# Altium footprint library xialeste-20221201.PcbLib: 195 footprints (part 8 of 13)
Each footprint in its own frame and in the unit in brackets; x right, y up, seen from the top. Pads: shape width x height; smd on the part's side, far side on the other; paste and mask are expansions set on the pad; w line width, h text height; cw(c..) or ccw(c..) is an arc to the next point about the centre after c.
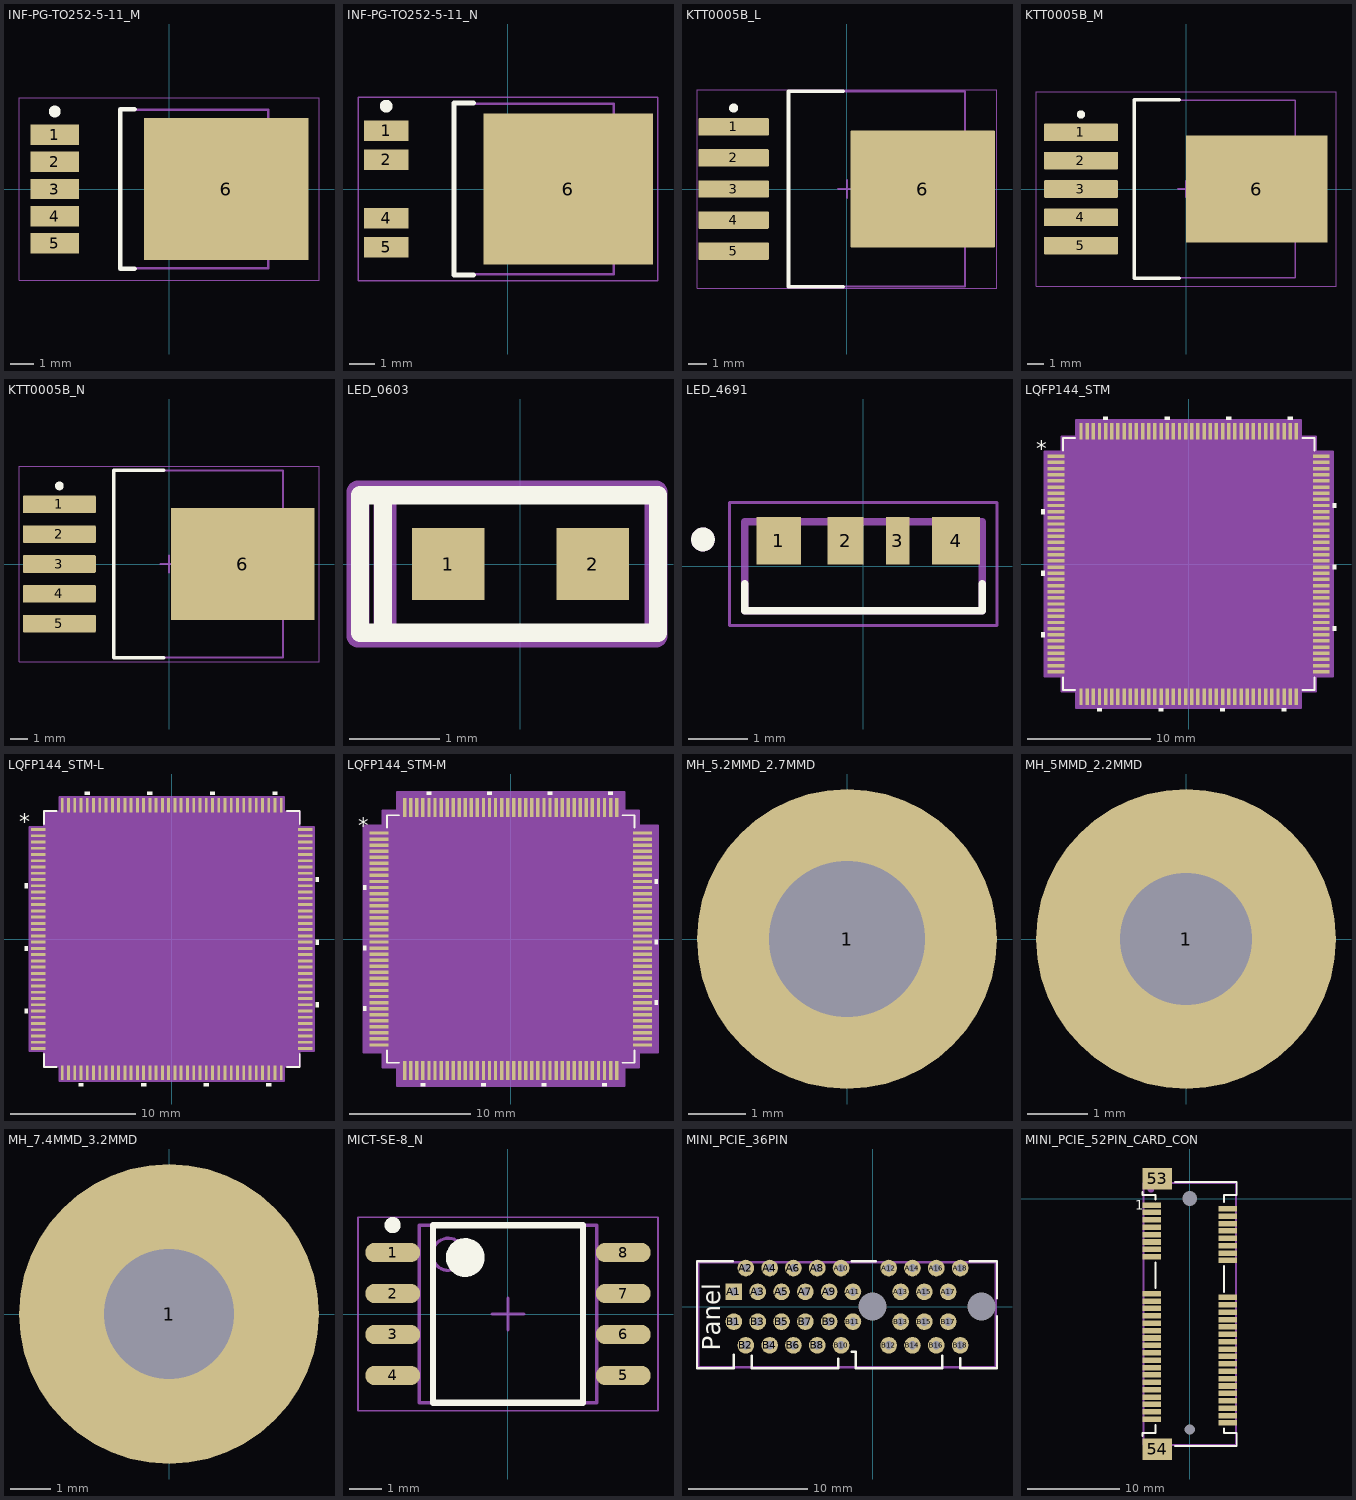
[diagram p7: the footprints below, top view; thin cyan lines are the x and y axes]

## INF-PG-TO252-5-11_M [mm] "DPAK, 5-Leads, Body 6.5x6.12mm, Pitch 1.14mm, IPC Low Density"
height 2.35
pads (6):
  rect 2.05x0.85 smd: 1(-4.8,2.28) 2(-4.8,1.14) 3(-4.8,0) 4(-4.8,-1.14) 5(-4.8,-2.28)
  rect 6.9x5.95 smd: 6(2.4,0)
Top Overlay:
  circle w0.25: c-4.8,3.255 r0.125
  lines w0.2: -1.45,-3.35 -2.05,-3.35 -2.05,3.35 -1.45,3.35
Mechanical 13:
  lines w0.1: -2.05,-3.325 4.17,-3.325 4.17,3.325 -2.05,3.325 -2.05,-3.325
Mechanical 15:
  lines w0.05: -6.3,-3.825 6.3,-3.825 6.3,3.825 -6.3,3.825 -6.3,-3.825
  lines w0.1: -0.5,0 0.5,0 ; 0,-0.5 0,0.5
3D body "to252-4_p1-27_l6-8_w5-8.stp": height 2.4, standoff -0.01, extent -5.316,-3.435 4.884,3.365

## INF-PG-TO252-5-11_N [mm] "DPAK, 5-Leads, Body 6.5x6.12mm, Pitch 1.14mm, IPC Medium Density"
height 2.35
pads (5):
  rect 1.75x0.8 smd: 1(-4.75,2.28) 2(-4.75,1.14) 4(-4.75,-1.14) 5(-4.75,-2.28)
  rect 6.6x5.9 smd: 6(2.35,0)
Top Overlay:
  circle w0.25: c-4.75,3.23 r0.125
  lines w0.2: -1.35,-3.35 -2.1,-3.35 -2.1,3.35 -1.35,3.35
Mechanical 13:
  lines w0.1: -2.1,-3.325 4.12,-3.325 4.12,3.325 -2.1,3.325 -2.1,-3.325
Mechanical 15:
  lines w0.05: -5.85,-3.575 5.85,-3.575 5.85,3.575 -5.85,3.575 -5.85,-3.575
  lines w0.1: -0.5,0 0.5,0 ; 0,-0.5 0,0.5
3D body: height 2.35, standoff 0, extent -2.1,-3.325 4.12,3.325

## KTT0005B_L [mm] "DPAK, 5-Leads, Body 10.65x9.65mm, Pitch 1.7mm, IPC High Density"
height 4.83
pads (6):
  rrect11% 3.85x0.95 smd: 1(-6.2,3.4) 2(-6.2,1.7) 3(-6.2,0) 4(-6.2,-1.7) 5(-6.2,-3.4)
  rrect2% 7.9x6.4 smd: 6(4.15,0)
Top Overlay:
  circle w0.25: c-6.2,4.425 r0.125
  lines w0.2: -0.2,-5.35 -3.2,-5.35 -3.2,5.35 -0.2,5.35
Mechanical 1:
  text ".Designator" at -1.905,-0.508 h1.3
Mechanical 13:
  lines w0.1: -3.2,-5.325 -3.2,5.325 6.45,5.325 6.45,-5.325 -3.2,-5.325
Mechanical 15:
  lines w0.05: -8.2,-5.425 -8.2,5.425 8.2,5.425 8.2,-5.425 -8.2,-5.425
  lines w0.1: -0.5,0 0.5,0 ; 0,-0.5 0,0.5
3D body: height 4.83, standoff 0, extent -3.2,-5.325 6.45,5.325

## KTT0005B_M [mm] "DPAK, 5-Leads, Body 10.65x9.65mm, Pitch 1.7mm, IPC Low Density"
height 4.83
pads (6):
  rrect10% 4.45x1.05 smd: 1(-6.3,3.4) 2(-6.3,1.7) 3(-6.3,0) 4(-6.3,-1.7) 5(-6.3,-3.4)
  rrect2% 8.5x6.45 smd: 6(4.25,0)
Top Overlay:
  circle w0.25: c-6.3,4.475 r0.125
  lines w0.2: -0.4,-5.35 -3.1,-5.35 -3.1,5.35 -0.4,5.35
Mechanical 1:
  text ".Designator" at -2.225,-0.779 h1.3
Mechanical 13:
  lines w0.1: -3.1,-5.325 -3.1,5.325 6.55,5.325 6.55,-5.325 -3.1,-5.325
Mechanical 15:
  lines w0.05: -9,-5.825 -9,5.825 9,5.825 9,-5.825 -9,-5.825
  lines w0.1: -0.5,0 0.5,0 ; 0,-0.5 0,0.5
3D body "TO-263BA.stp": height 4.8, standoff 0, extent -7.825,-5.293 8.025,5.35

## KTT0005B_N [mm] "DPAK, 5-Leads, Body 10.65x9.65mm, Pitch 1.7mm, IPC Medium Density"
height 4.83
pads (6):
  rrect10% 4.15x1 smd: 1(-6.25,3.4) 2(-6.25,1.7) 3(-6.25,0) 4(-6.25,-1.7) 5(-6.25,-3.4)
  rrect2% 8.2x6.4 smd: 6(4.2,0)
Top Overlay:
  circle w0.25: c-6.25,4.45 r0.125
  lines w0.2: -0.3,-5.35 -3.15,-5.35 -3.15,5.35 -0.3,5.35
Mechanical 1:
  text ".Designator" at -1.905,-0.508 h1.3
Mechanical 13:
  lines w0.1: -3.15,-5.325 -3.15,5.325 6.5,5.325 6.5,-5.325 -3.15,-5.325
Mechanical 15:
  lines w0.05: -8.55,-5.575 -8.55,5.575 8.55,5.575 8.55,-5.575 -8.55,-5.575
  lines w0.1: -0.5,0 0.5,0 ; 0,-0.5 0,0.5
3D body "TO-263BA.stp": height 4.8, standoff 0, extent -7.99,-5.324 7.86,5.319

## LED_0603 [mm]
pads (2):
  rect 0.8x0.8 smd: 1(-0.8,0) 2(0.8,0)
Top Overlay:
  lines w0.2: -1.524,-0.762 -1.524,0.762 ; -1.778,-0.762 1.524,-0.762 1.524,0.762 -1.778,0.762 -1.778,-0.762
Mechanical 29:
  lines w0.254: -1.5,-0.8 -1.5,0.8 ; -1.8,-0.8 -1.8,0.8 1.5,0.8 1.5,-0.8 -1.8,-0.8
  text ".Designator" at 0.5,0.3 h0.6
3D body "LED SMD 0603.step": height 0.65, standoff 0, extent -0.85,-0.4 0.85,0.4
3D body: height 0.66, standoff 0.5, extent -0.2,-0.2 0.2,0.2

## LED_4691 [mm]
height 2.05
pads (4):
  rect 0.75x0.8 smd: 1(-1.425,0.425)
  rect 0.6x0.8 smd: 2(-0.3,0.425)
  rect 0.4x0.8 smd: 3(0.58,0.425)
  rect 0.8x0.8 smd: 4(1.56,0.425)
Top Overlay:
  circle w0.2: c-2.7,0.45 r0.1
  lines w0.127: -2,-0.295 -2,-0.75 2,-0.75 2,-0.295
Mechanical 13:
  circle w0.2: c-2.7,0.45 r0.1
  lines w0.127: -2,-0.75 2,-0.75 2,0.75 -2,0.75 -2,-0.75
Mechanical 15:
  lines w0.05: -2.25,-1 2.25,-1 2.25,1.075 -2.25,1.075 -2.25,-1

## LQFP144_STM [mil]
pads (144):
  rect 53.5x11 smd paste+0 mask+0: 1(-424.25,344.49) 2(-424.25,324.8) 3(-424.25,305.12) 4(-424.25,285.43) 5(-424.25,265.75) 6(-424.25,246.06) 7(-424.25,226.38) 8(-424.25,206.69) 9(-424.25,187.01) 10(-424.25,167.32) 11(-424.25,147.64) 12(-424.25,127.95) 13(-424.25,108.27) 14(-424.25,88.58) 15(-424.25,68.9) 16(-424.25,49.21) 17(-424.25,29.53) 18(-424.25,9.84) 19(-424.25,-9.84) 20(-424.25,-29.53) 21(-424.25,-49.21) 22(-424.25,-68.9) 23(-424.25,-88.58) 24(-424.25,-108.27) 25(-424.25,-127.95) 26(-424.25,-147.64) 27(-424.25,-167.32) 28(-424.25,-187.01) 29(-424.25,-206.69) 30(-424.25,-226.38) 31(-424.25,-246.06) 32(-424.25,-265.75) 33(-424.25,-285.43) 34(-424.25,-305.12) 35(-424.25,-324.8) 36(-424.25,-344.49) 73(424.25,-344.49) 74(424.25,-324.8) 75(424.25,-305.12) 76(424.25,-285.43) 77(424.25,-265.75) 78(424.25,-246.06) 79(424.25,-226.38) 80(424.25,-206.69) 81(424.25,-187.01) 82(424.25,-167.32) 83(424.25,-147.64) 84(424.25,-127.95) 85(424.25,-108.27) 86(424.25,-88.58) 87(424.25,-68.9) 88(424.25,-49.21) 89(424.25,-29.53) 90(424.25,-9.84) 91(424.25,9.84) 92(424.25,29.53) 93(424.25,49.21) 94(424.25,68.9) 95(424.25,88.58) 96(424.25,108.27) 97(424.25,127.95) 98(424.25,147.64) 99(424.25,167.32) 100(424.25,187.01) 101(424.25,206.69) 102(424.25,226.38) 103(424.25,246.06) 104(424.25,265.75) 105(424.25,285.43) 106(424.25,305.12) 107(424.25,324.8) 108(424.25,344.49)
  rect 11x53.5 smd paste+0 mask+0: 37(-344.49,-424.25) 38(-324.8,-424.25) 39(-305.12,-424.25) 40(-285.43,-424.25) 41(-265.75,-424.25) 42(-246.06,-424.25) 43(-226.38,-424.25) 44(-206.69,-424.25) 45(-187.01,-424.25) 46(-167.32,-424.25) 47(-147.64,-424.25) 48(-127.95,-424.25) 49(-108.27,-424.25) 50(-88.58,-424.25) 51(-68.9,-424.25) 52(-49.21,-424.25) 53(-29.53,-424.25) 54(-9.84,-424.25) 55(9.84,-424.25) 56(29.53,-424.25) 57(49.21,-424.25) 58(68.9,-424.25) 59(88.58,-424.25) 60(108.27,-424.25) 61(127.95,-424.25) 62(147.64,-424.25) 63(167.32,-424.25) 64(187.01,-424.25) 65(206.69,-424.25) 66(226.38,-424.25) 67(246.06,-424.25) 68(265.75,-424.25) 69(285.43,-424.25) 70(305.12,-424.25) 71(324.8,-424.25) 72(344.49,-424.25) 109(344.49,424.25) 110(324.8,424.25) 111(305.12,424.25) 112(285.43,424.25) 113(265.75,424.25) 114(246.06,424.25) 115(226.38,424.25) 116(206.69,424.25) 117(187.01,424.25) 118(167.32,424.25) 119(147.64,424.25) 120(127.95,424.25) 121(108.27,424.25) 122(88.58,424.25) 123(68.9,424.25) 124(49.21,424.25) 125(29.53,424.25) 126(9.84,424.25) 127(-9.84,424.25) 128(-29.53,424.25) 129(-49.21,424.25) 130(-68.9,424.25) 131(-88.58,424.25) 132(-108.27,424.25) 133(-127.95,424.25) 134(-147.64,424.25) 135(-167.32,424.25) 136(-187.01,424.25) 137(-206.69,424.25) 138(-226.38,424.25) 139(-246.06,424.25) 140(-265.75,424.25) 141(-285.43,424.25) 142(-305.12,424.25) 143(-324.8,424.25) 144(-344.49,424.25)
Top Overlay:
  region: -461,174.82 -471,174.82 -471,159.82 -461,159.82
  region: -461,-22.03 -471,-22.03 -471,-37.03 -461,-37.03
  region: -461,-218.88 -471,-218.88 -471,-233.88 -461,-233.88
  region: -277.93,-461 -292.93,-461 -292.93,-471 -277.93,-471
  region: -81.08,-461 -96.08,-461 -96.08,-471 -81.08,-471
  region: 115.77,-461 100.77,-461 100.77,-471 115.77,-471
  region: 312.62,-461 297.62,-461 297.62,-471 312.62,-471
  region: 461,-199.19 471,-199.19 471,-214.19 461,-214.19
  region: 461,-2.34 471,-2.34 471,-17.34 461,-17.34
  region: 461,194.51 471,194.51 471,179.51 461,179.51
  region: 332.3,461 317.3,461 317.3,471 332.3,471
  region: 135.45,461 120.45,461 120.45,471 135.45,471
  region: -61.4,461 -76.4,461 -76.4,471 -61.4,471
  region: -258.25,461 -273.25,461 -273.25,471 -258.25,471
  lines w6: -402.5,-363.09 -402.5,-402.5 -363.09,-402.5 ; -402.5,363.09 -402.5,402.5 -363.09,402.5 ; 363.09,-402.5 402.5,-402.5 402.5,-363.09 ; 363.09,402.5 402.5,402.5 402.5,363.09
  text "*" at -488.5,344.33 h50
Mechanical 13:
  drawing of 581 lines, arcs and shapes, not listed
  text "*" at -395,329.33 h50
Mechanical 15:
  region: -359.99,-407.5 -407.5,-407.5 -407.5,-359.99 -461,-359.99 -461,359.99 -407.5,359.99 -407.5,407.5 -359.99,407.5 -359.99,461 359.99,461 359.99,407.5 407.5,407.5 407.5,359.99 461,359.99 461,-359.99 407.5,-359.99 407.5,-407.5 359.99,-407.5 359.99,-461 -359.99,-461
  lines w6: -461,-359.99 -407.5,-359.99 -407.5,-407.5 -359.99,-407.5 -359.99,-461 359.99,-461 359.99,-407.5 407.5,-407.5 407.5,-359.99 461,-359.99 461,359.99 407.5,359.99 407.5,407.5 359.99,407.5 359.99,461 -359.99,461 -359.99,407.5 -407.5,407.5 -407.5,359.99 -461,359.99 -461,-359.99
3D body "LQFP144_STM.step": height 63.11, standoff 0, extent -437.01,-437.01 437.01,437.01

## LQFP144_STM-L [mil]
pads (144):
  rect 45.5x9 smd paste+0 mask+0: 1(-420.25,344.49) 2(-420.25,324.8) 3(-420.25,305.12) 4(-420.25,285.43) 5(-420.25,265.75) 6(-420.25,246.06) 7(-420.25,226.38) 8(-420.25,206.69) 9(-420.25,187.01) 10(-420.25,167.32) 11(-420.25,147.64) 12(-420.25,127.95) 13(-420.25,108.27) 14(-420.25,88.58) 15(-420.25,68.9) 16(-420.25,49.21) 17(-420.25,29.53) 18(-420.25,9.84) 19(-420.25,-9.84) 20(-420.25,-29.53) 21(-420.25,-49.21) 22(-420.25,-68.9) 23(-420.25,-88.58) 24(-420.25,-108.27) 25(-420.25,-127.95) 26(-420.25,-147.64) 27(-420.25,-167.32) 28(-420.25,-187.01) 29(-420.25,-206.69) 30(-420.25,-226.38) 31(-420.25,-246.06) 32(-420.25,-265.75) 33(-420.25,-285.43) 34(-420.25,-305.12) 35(-420.25,-324.8) 36(-420.25,-344.49) 73(420.25,-344.49) 74(420.25,-324.8) 75(420.25,-305.12) 76(420.25,-285.43) 77(420.25,-265.75) 78(420.25,-246.06) 79(420.25,-226.38) 80(420.25,-206.69) 81(420.25,-187.01) 82(420.25,-167.32) 83(420.25,-147.64) 84(420.25,-127.95) 85(420.25,-108.27) 86(420.25,-88.58) 87(420.25,-68.9) 88(420.25,-49.21) 89(420.25,-29.53) 90(420.25,-9.84) 91(420.25,9.84) 92(420.25,29.53) 93(420.25,49.21) 94(420.25,68.9) 95(420.25,88.58) 96(420.25,108.27) 97(420.25,127.95) 98(420.25,147.64) 99(420.25,167.32) 100(420.25,187.01) 101(420.25,206.69) 102(420.25,226.38) 103(420.25,246.06) 104(420.25,265.75) 105(420.25,285.43) 106(420.25,305.12) 107(420.25,324.8) 108(420.25,344.49)
  rect 9x45.5 smd paste+0 mask+0: 37(-344.49,-420.25) 38(-324.8,-420.25) 39(-305.12,-420.25) 40(-285.43,-420.25) 41(-265.75,-420.25) 42(-246.06,-420.25) 43(-226.38,-420.25) 44(-206.69,-420.25) 45(-187.01,-420.25) 46(-167.32,-420.25) 47(-147.64,-420.25) 48(-127.95,-420.25) 49(-108.27,-420.25) 50(-88.58,-420.25) 51(-68.9,-420.25) 52(-49.21,-420.25) 53(-29.53,-420.25) 54(-9.84,-420.25) 55(9.84,-420.25) 56(29.53,-420.25) 57(49.21,-420.25) 58(68.9,-420.25) 59(88.58,-420.25) 60(108.27,-420.25) 61(127.95,-420.25) 62(147.64,-420.25) 63(167.32,-420.25) 64(187.01,-420.25) 65(206.69,-420.25) 66(226.38,-420.25) 67(246.06,-420.25) 68(265.75,-420.25) 69(285.43,-420.25) 70(305.12,-420.25) 71(324.8,-420.25) 72(344.49,-420.25) 109(344.49,420.25) 110(324.8,420.25) 111(305.12,420.25) 112(285.43,420.25) 113(265.75,420.25) 114(246.06,420.25) 115(226.38,420.25) 116(206.69,420.25) 117(187.01,420.25) 118(167.32,420.25) 119(147.64,420.25) 120(127.95,420.25) 121(108.27,420.25) 122(88.58,420.25) 123(68.9,420.25) 124(49.21,420.25) 125(29.53,420.25) 126(9.84,420.25) 127(-9.84,420.25) 128(-29.53,420.25) 129(-49.21,420.25) 130(-68.9,420.25) 131(-88.58,420.25) 132(-108.27,420.25) 133(-127.95,420.25) 134(-147.64,420.25) 135(-167.32,420.25) 136(-187.01,420.25) 137(-206.69,420.25) 138(-226.38,420.25) 139(-246.06,420.25) 140(-265.75,420.25) 141(-285.43,420.25) 142(-305.12,420.25) 143(-324.8,420.25) 144(-344.49,420.25)
Top Overlay:
  region: -258.25,453 -273.25,453 -273.25,463 -258.25,463
  region: -61.4,453 -76.4,453 -76.4,463 -61.4,463
  region: 135.45,453 120.45,453 120.45,463 135.45,463
  region: 332.3,453 317.3,453 317.3,463 332.3,463
  region: 453,194.51 463,194.51 463,179.51 453,179.51
  region: 453,-2.34 463,-2.34 463,-17.34 453,-17.34
  region: 453,-199.19 463,-199.19 463,-214.19 453,-214.19
  region: 312.62,-453 297.62,-453 297.62,-463 312.62,-463
  region: 115.77,-453 100.77,-453 100.77,-463 115.77,-463
  region: -81.08,-453 -96.08,-453 -96.08,-463 -81.08,-463
  region: -277.93,-453 -292.93,-453 -292.93,-463 -277.93,-463
  region: -453,-218.88 -463,-218.88 -463,-233.88 -453,-233.88
  region: -453,-22.03 -463,-22.03 -463,-37.03 -453,-37.03
  region: -453,174.82 -463,174.82 -463,159.82 -453,159.82
  lines w6: -402.5,-362.09 -402.5,-402.5 -362.09,-402.5 ; -402.5,362.09 -402.5,402.5 -362.09,402.5 ; 362.09,-402.5 402.5,-402.5 402.5,-362.09 ; 362.09,402.5 402.5,402.5 402.5,362.09
  text "*" at -480.5,344.33 h50
Mechanical 13:
  drawing of 581 lines, arcs and shapes, not listed
  text "*" at -395,329.33 h50
Mechanical 15:
  region: -352.99,-401.5 -401.5,-401.5 -401.5,-352.99 -447,-352.99 -447,352.99 -401.5,352.99 -401.5,401.5 -352.99,401.5 -352.99,447 352.99,447 352.99,401.5 401.5,401.5 401.5,352.99 447,352.99 447,-352.99 401.5,-352.99 401.5,-401.5 352.99,-401.5 352.99,-447 -352.99,-447
  lines w6: -447,-352.99 -447,352.99 -401.5,352.99 -401.5,401.5 -352.99,401.5 -352.99,447 352.99,447 352.99,401.5 401.5,401.5 401.5,352.99 447,352.99 447,-352.99 401.5,-352.99 401.5,-401.5 352.99,-401.5 352.99,-447 -352.99,-447 -352.99,-401.5 -401.5,-401.5 -401.5,-352.99 -447,-352.99
3D body "LQFP144_STM.step": height 63.11, standoff 0, extent -437.01,-437.01 437.01,437.01

## LQFP144_STM-M [mil]
pads (144):
  rect 61.5x11 smd paste+0 mask+0: 1(-428.25,344.49) 2(-428.25,324.8) 3(-428.25,305.12) 4(-428.25,285.43) 5(-428.25,265.75) 6(-428.25,246.06) 7(-428.25,226.38) 8(-428.25,206.69) 9(-428.25,187.01) 10(-428.25,167.32) 11(-428.25,147.64) 12(-428.25,127.95) 13(-428.25,108.27) 14(-428.25,88.58) 15(-428.25,68.9) 16(-428.25,49.21) 17(-428.25,29.53) 18(-428.25,9.84) 19(-428.25,-9.84) 20(-428.25,-29.53) 21(-428.25,-49.21) 22(-428.25,-68.9) 23(-428.25,-88.58) 24(-428.25,-108.27) 25(-428.25,-127.95) 26(-428.25,-147.64) 27(-428.25,-167.32) 28(-428.25,-187.01) 29(-428.25,-206.69) 30(-428.25,-226.38) 31(-428.25,-246.06) 32(-428.25,-265.75) 33(-428.25,-285.43) 34(-428.25,-305.12) 35(-428.25,-324.8) 36(-428.25,-344.49) 73(428.25,-344.49) 74(428.25,-324.8) 75(428.25,-305.12) 76(428.25,-285.43) 77(428.25,-265.75) 78(428.25,-246.06) 79(428.25,-226.38) 80(428.25,-206.69) 81(428.25,-187.01) 82(428.25,-167.32) 83(428.25,-147.64) 84(428.25,-127.95) 85(428.25,-108.27) 86(428.25,-88.58) 87(428.25,-68.9) 88(428.25,-49.21) 89(428.25,-29.53) 90(428.25,-9.84) 91(428.25,9.84) 92(428.25,29.53) 93(428.25,49.21) 94(428.25,68.9) 95(428.25,88.58) 96(428.25,108.27) 97(428.25,127.95) 98(428.25,147.64) 99(428.25,167.32) 100(428.25,187.01) 101(428.25,206.69) 102(428.25,226.38) 103(428.25,246.06) 104(428.25,265.75) 105(428.25,285.43) 106(428.25,305.12) 107(428.25,324.8) 108(428.25,344.49)
  rect 11x61.5 smd paste+0 mask+0: 37(-344.49,-428.25) 38(-324.8,-428.25) 39(-305.12,-428.25) 40(-285.43,-428.25) 41(-265.75,-428.25) 42(-246.06,-428.25) 43(-226.38,-428.25) 44(-206.69,-428.25) 45(-187.01,-428.25) 46(-167.32,-428.25) 47(-147.64,-428.25) 48(-127.95,-428.25) 49(-108.27,-428.25) 50(-88.58,-428.25) 51(-68.9,-428.25) 52(-49.21,-428.25) 53(-29.53,-428.25) 54(-9.84,-428.25) 55(9.84,-428.25) 56(29.53,-428.25) 57(49.21,-428.25) 58(68.9,-428.25) 59(88.58,-428.25) 60(108.27,-428.25) 61(127.95,-428.25) 62(147.64,-428.25) 63(167.32,-428.25) 64(187.01,-428.25) 65(206.69,-428.25) 66(226.38,-428.25) 67(246.06,-428.25) 68(265.75,-428.25) 69(285.43,-428.25) 70(305.12,-428.25) 71(324.8,-428.25) 72(344.49,-428.25) 109(344.49,428.25) 110(324.8,428.25) 111(305.12,428.25) 112(285.43,428.25) 113(265.75,428.25) 114(246.06,428.25) 115(226.38,428.25) 116(206.69,428.25) 117(187.01,428.25) 118(167.32,428.25) 119(147.64,428.25) 120(127.95,428.25) 121(108.27,428.25) 122(88.58,428.25) 123(68.9,428.25) 124(49.21,428.25) 125(29.53,428.25) 126(9.84,428.25) 127(-9.84,428.25) 128(-29.53,428.25) 129(-49.21,428.25) 130(-68.9,428.25) 131(-88.58,428.25) 132(-108.27,428.25) 133(-127.95,428.25) 134(-147.64,428.25) 135(-167.32,428.25) 136(-187.01,428.25) 137(-206.69,428.25) 138(-226.38,428.25) 139(-246.06,428.25) 140(-265.75,428.25) 141(-285.43,428.25) 142(-305.12,428.25) 143(-324.8,428.25) 144(-344.49,428.25)
Top Overlay:
  region: -469,174.82 -479,174.82 -479,159.82 -469,159.82
  region: -469,-22.03 -479,-22.03 -479,-37.03 -469,-37.03
  region: -469,-218.88 -479,-218.88 -479,-233.88 -469,-233.88
  region: -277.93,-469 -292.93,-469 -292.93,-479 -277.93,-479
  region: -81.08,-469 -96.08,-469 -96.08,-479 -81.08,-479
  region: 115.77,-469 100.77,-469 100.77,-479 115.77,-479
  region: 312.62,-469 297.62,-469 297.62,-479 312.62,-479
  region: 469,-199.19 479,-199.19 479,-214.19 469,-214.19
  region: 469,-2.34 479,-2.34 479,-17.34 469,-17.34
  region: 469,194.51 479,194.51 479,179.51 469,179.51
  region: 332.3,469 317.3,469 317.3,479 332.3,479
  region: 135.45,469 120.45,469 120.45,479 135.45,479
  region: -61.4,469 -76.4,469 -76.4,479 -61.4,479
  region: -258.25,469 -273.25,469 -273.25,479 -258.25,479
  lines w6: -402.5,-363.09 -402.5,-402.5 -363.09,-402.5 ; -402.5,363.09 -402.5,402.5 -363.09,402.5 ; 363.09,-402.5 402.5,-402.5 402.5,-363.09 ; 363.09,402.5 402.5,402.5 402.5,363.09
  text "*" at -496.5,344.33 h50
Mechanical 13:
  drawing of 581 lines, arcs and shapes, not listed
  text "*" at -395,329.33 h50
Mechanical 15:
  region: -369.99,-417.5 -417.5,-417.5 -417.5,-369.99 -479,-369.99 -479,369.99 -417.5,369.99 -417.5,417.5 -369.99,417.5 -369.99,479 369.99,479 369.99,417.5 417.5,417.5 417.5,369.99 479,369.99 479,-369.99 417.5,-369.99 417.5,-417.5 369.99,-417.5 369.99,-479 -369.99,-479
  lines w6: -479,-369.99 -417.5,-369.99 -417.5,-417.5 -369.99,-417.5 -369.99,-479 369.99,-479 369.99,-417.5 417.5,-417.5 417.5,-369.99 479,-369.99 479,369.99 417.5,369.99 417.5,417.5 369.99,417.5 369.99,479 -369.99,479 -369.99,417.5 -417.5,417.5 -417.5,369.99 -479,369.99 -479,-369.99
3D body "LQFP144_STM.step": height 63.11, standoff 0, extent -437.01,-437.01 437.01,437.01

## MH_5.2MMD_2.7MMD [mm] "Creator MM"
pads (1):
  round 5.2 / inner round 3.683 / far side round 5.2 hole 2.7: 1(0,0)

## MH_5MMD_2.2MMD [mm]
pads (1):
  round 5 / inner round 3.683 / far side round 5 hole 2.2: 1(0,0)

## MH_7.4MMD_3.2MMD [mm]
pads (1):
  round 7.4 / inner round 3.683 / far side round 7.4 hole 3.2 mask+0.025: 1(0,0)

## MICT-SE-8_N [mm] "SOIC, 8-Leads, Body 5.5x5.5mm, Pitch 1.27mm, IPC Medium Density"
pads (8):
  oval 1.7x0.6 smd: 1(-3.575,1.905) 2(-3.575,0.635) 3(-3.575,-0.635) 4(-3.575,-1.905) 5(3.575,-1.905) 6(3.575,-0.635) 7(3.575,0.635) 8(3.575,1.905)
Top Overlay:
  circle w0.6: c-1.325,1.75 r0.3
  circle w0.25: c-3.575,2.755 r0.125
  lines w0.2: -2.325,-2.75 2.325,-2.75 2.325,2.75 -2.325,2.75 -2.325,-2.75
Mechanical 13:
  circle w0.1: c-1.85,1.85 r0.5
  lines w0.1: -2.75,-2.75 2.75,-2.75 2.75,2.75 -2.75,2.75 -2.75,-2.75
Mechanical 15:
  lines w0.05: -4.65,-3 4.65,-3 4.65,3 -4.65,3 -4.65,-3
  lines w0.1: -0.5,0 0.5,0 ; 0,-0.5 0,0.5
3D body "SO8W_5P49X5P49_MRN.step": height 1.7, standoff 0, extent -4.051,-2.642 4.051,2.642

## MINI_PCIE_36PIN [mm] "Creator MM. Bad shape of 3d model."
height 11.25
pads (38):
  rrect0% 0x0 hole 2.35: 1(0,0) 2(9.15,0)
  rect 1.4x1.4 hole 0.7: A1(-11.65,1.25)
  round 1.4 hole 0.7: A2(-10.65,3.25) A3(-9.65,1.25) A4(-8.65,3.25) A5(-7.65,1.25) A6(-6.65,3.25) A7(-5.65,1.25) A8(-4.65,3.25) A9(-3.65,1.25) A10(-2.65,3.25) A11(-1.65,1.25) A12(1.35,3.25) A13(2.35,1.25) A14(3.35,3.25) A15(4.35,1.25) A16(5.35,3.25) A17(6.35,1.25) A18(7.35,3.25) B1(-11.65,-1.25) B2(-10.65,-3.25) B3(-9.65,-1.25) B4(-8.65,-3.25) B5(-7.65,-1.25) B6(-6.65,-3.25) B7(-5.65,-1.25) B8(-4.65,-3.25) B9(-3.65,-1.25) B10(-2.65,-3.25) B11(-1.65,-1.25) B12(1.35,-3.25) B13(2.35,-1.25) B14(3.35,-3.25) B15(4.35,-1.25) B16(5.35,-3.25) B17(6.35,-1.25) B18(7.35,-3.25)
Top Overlay:
  lines w0.2: -11.75,3.825 -14.75,3.825 -14.75,-5.175 -11.65,-5.175 -11.65,-4.025 ; -10.15,-4.125 -10.15,-5.175 -2.9,-5.175 -2.9,-4.375 ; -1.75,-3.775 -1.4,-3.775 -1.4,-5.175 5.85,-5.175 5.85,-4.125 ; -1.75,3.825 0.25,3.825 ; 7.35,-4.325 7.35,-5.175 10.45,-5.175 10.45,-0.8 ; 8.15,3.825 10.45,3.825 10.45,0.7
  text "Panel" at -12.8,-3.7 h1.5
Mechanical 29:
  lines w0.2: -14.65,-5.075 -14.65,3.725 10.35,3.725 10.35,-5.075 -14.65,-5.075
  text ".Designator" at -0.5,0.3 h1.52
3D body "c-4-1612163-1-h-3d.stp": height 10, standoff -5.4, extent -14.65,-5.1 10.35,3.6

## MINI_PCIE_52PIN_CARD_CON [mm] "Creator MM"
height 5.9
pads (56):
  rect 2x0.6 smd mask+0.05: 1(-4.1,-0.7) 2(4.1,-1.1) 3(-4.1,-1.5) 4(4.1,-1.9) 5(-4.1,-2.3) 6(4.1,-2.7) 7(-4.1,-3.1) 8(4.1,-3.5) 9(-4.1,-3.9) 10(4.1,-4.3) 11(-4.1,-4.7) 12(4.1,-5.1) 13(-4.1,-5.5) 14(4.1,-5.9) 15(-4.1,-6.3) 16(4.1,-6.7) 17(-4.1,-10.3) 18(4.1,-10.7) 19(-4.1,-11.1) 20(4.1,-11.5) 21(-4.1,-11.9) 22(4.1,-12.3) 23(-4.1,-12.7) 24(4.1,-13.1) 25(-4.1,-13.5) 26(4.1,-13.9) 27(-4.1,-14.3) 28(4.1,-14.7) 29(-4.1,-15.1) 30(4.1,-15.5) 31(-4.1,-15.9) 32(4.1,-16.3) 33(-4.1,-16.7) 34(4.1,-17.1) 35(-4.1,-17.5) 36(4.1,-17.9) 37(-4.1,-18.3) 38(4.1,-18.7) 39(-4.1,-19.1) 40(4.1,-19.5) 41(-4.1,-19.9) 42(4.1,-20.3) 43(-4.1,-20.7) 44(4.1,-21.1) 45(-4.1,-21.5) 46(4.1,-21.9) 47(-4.1,-22.3) 48(4.1,-22.7) 49(-4.1,-23.1) 50(4.1,-23.5) 51(-4.1,-23.9) 52(4.1,-24.3)
  rect 3.2x2.3 smd: 53(-3.5,2.15) 54(-3.5,-27.15)
  rrect0% 0x0 hole 1.6: 55(0,0)
  rrect0% 0x0 hole 1.1: 56(0,-25)
Top Overlay:
  lines w0.2: -5.1,-25.7 -5.1,-25.4 -3.7,-25.4 -3.7,-24.5 ; -5.1,0.7 -5.1,0.4 -3.7,0.4 -3.7,-0.1 ; -3.7,-9.7 -3.7,-6.9 ; -1.6,-26.8 5.1,-26.8 5.1,-25.4 3.7,-25.4 3.7,-24.9 ; -1.6,1.8 5.1,1.8 5.1,0.4 3.7,0.4 3.7,-0.4 ; 3.7,-10.1 3.7,-7.3
  text "1" at -5.9,-1.2 h1.02
Mechanical 29:
  circle w0.5: c-4.2,1 r0.1
  lines w0.2: -5,-26.7 -5,1.7 5,1.7 5,-26.7 -5,-26.7
  text ".Designator" at -0.8,-12.1 h1.52
3D body "K3D-MM60-52B1-E1-R2 JAE Connector Division Proprietary.STEP": height 5.95, standoff -0.75, extent -5,-27.35 5,2.35